# Altium footprint library Ixora.PcbLib: 199 footprints (part 12 of 13)
Each footprint in its own frame and in the unit in brackets; x right, y up, seen from the top. Pads: shape width x height; smd on the part's side, far side on the other; paste and mask are expansions set on the pad; w line width, h text height; cw(c..) or ccw(c..) is an arc to the next point about the centre after c.
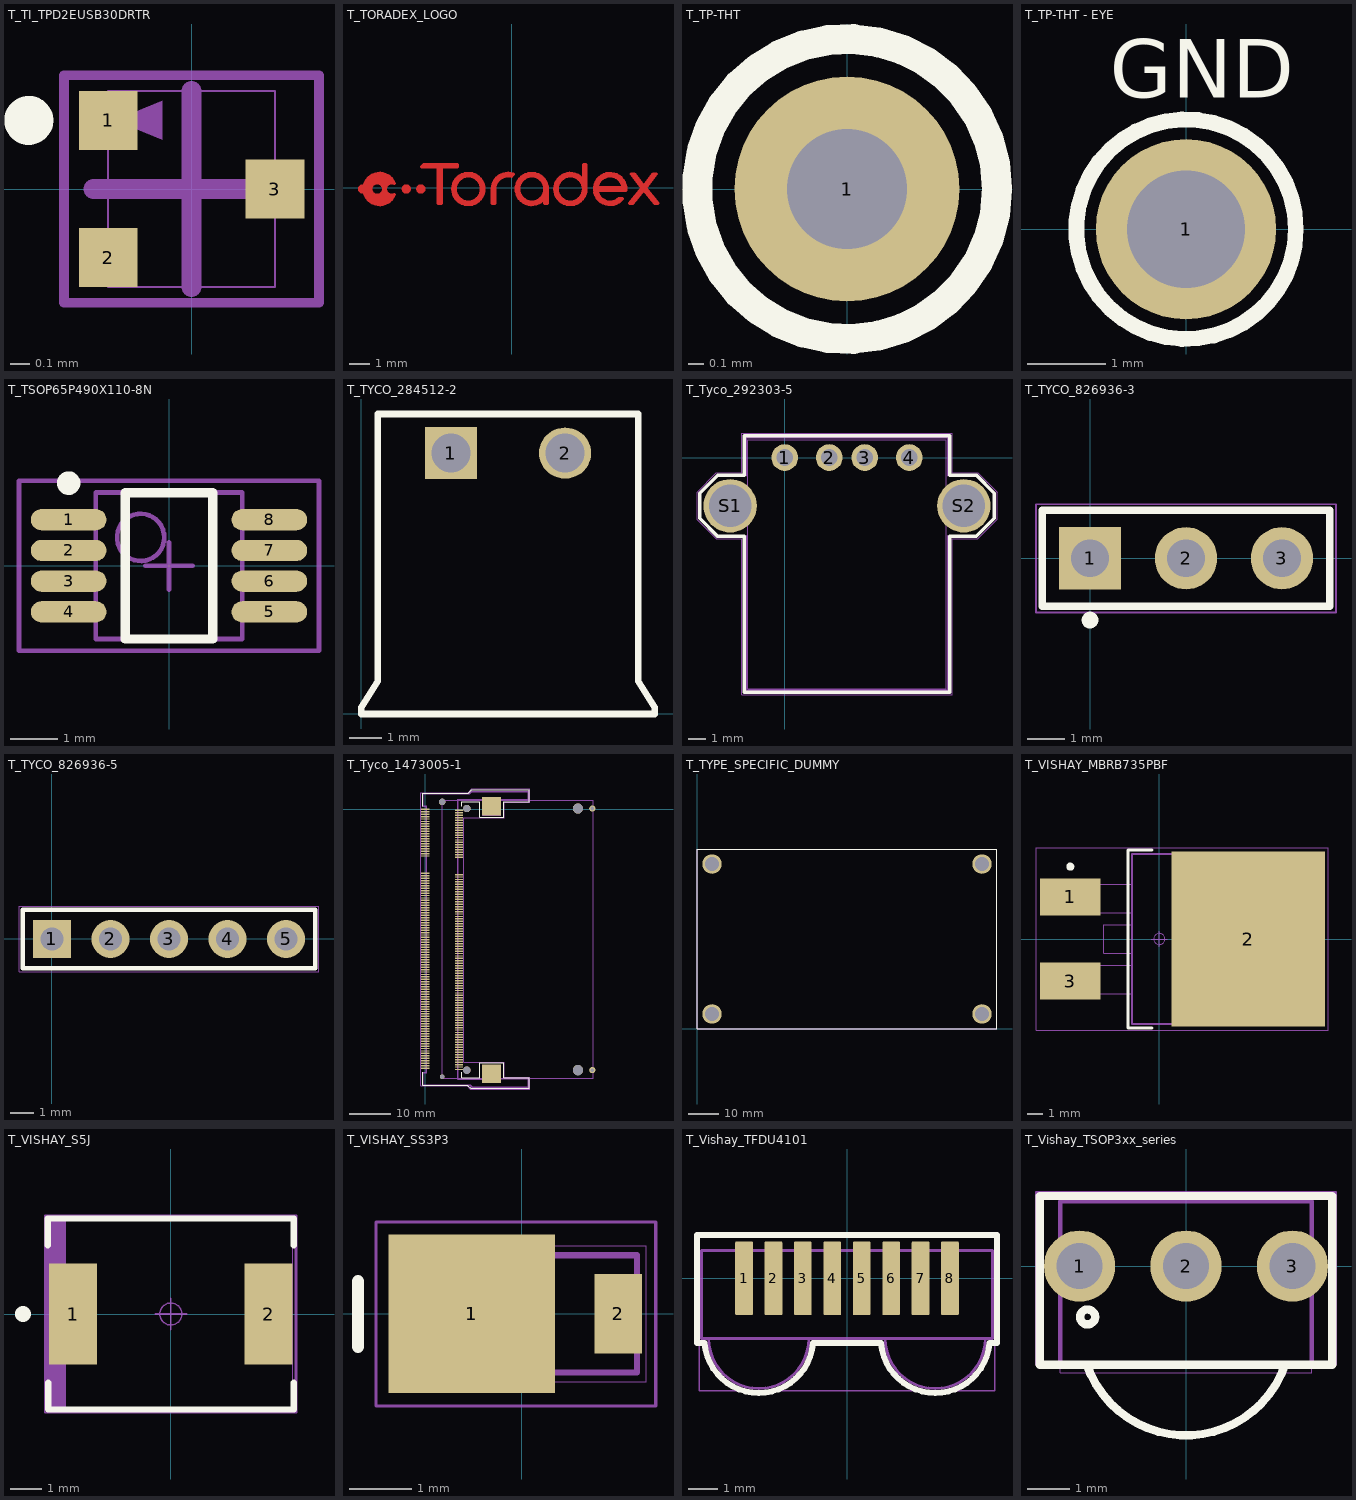
[diagram p11: the footprints below, top view; thin cyan lines are the x and y axes]

## T_TI_TPD2EUSB30DRTR [mm] "2 CHANNEL PROTECTION SOLUTION FOR SUPER-SPEED"
height 0.5
pads (3):
  rect 0.3x0.3 smd: 1(-0.425,0.35) 2(-0.425,-0.35) 3(0.425,0)
Top Overlay:
  circle w0.15: c-0.83,0.35 r0.05
Mechanical 1:
  lines w0.05: -0.65,-0.58 -0.65,0.58 0.65,0.58 0.65,-0.58 -0.65,-0.58
Mechanical 2:
  lines w0.01: -0.425,-0.5 0.425,-0.5 0.425,0.5 -0.425,0.5 -0.425,-0.5
Mechanical 3:
  region: -0.39,0.35 -0.15,0.45 -0.15,0.25
  lines w0.1: -0.5,0 0.5,0 ; 0,-0.5 0,0.5
3D body: height 0.5, standoff 0, extent -0.425,-0.5 0.425,0.5

## T_TORADEX_LOGO [mm] "Toradex Logo"
Top Layer:
  lines w0.15: -7.116,-0.05 -7,-0.05 ; -7.115,-0.198 cw(c-7.136,-0.05) -7.286,-0.05 cw(c-7.136,-0.05) -7.115,0.099 ; -7.044,-0.26 ccw(c-6.322,-0.05) -5.621,-0.319 ; -7.044,0.16 cw(c-6.322,-0.05) -5.621,0.22 ; -6.911,-0.118 ccw(c-7.104,-0.277) -7,-0.05 ; -6.911,0.019 cw(c-7.104,0.178) -7,-0.05 ; -6.764,-0.4 ccw(c-6.322,-0.05) -5.955,-0.477 cw(c-5.738,-0.05) -6.087,-0.379 cw(c-6.436,-0.05) -6.916,-0.05 cw(c-6.436,-0.05) -6.087,0.28 cw(c-5.738,-0.05) -5.955,0.378 ccw(c-6.322,-0.05) -6.764,0.301 ; -6.484,-0.59 ccw(c-6.436,-0.05) -6.087,-0.465 ccw(c-5.738,-0.05) -6.067,-0.481 cw(c-6.322,-0.05) -6.192,-0.533 ; -6.484,0.491 cw(c-6.436,-0.05) -6.087,0.366 cw(c-5.738,-0.05) -6.067,0.382 ccw(c-6.322,-0.05) -6.192,0.434 ; -5.636,-0.331 cw(c-5.738,-0.05) -5.636,0.232 ; 4.083,-0.046 4.702,-0.046 5.383,-0.046 ccw(c4.702,-0.05) 5.214,-0.499 ; 4.087,-0.116 4.702,-0.116 5.45,-0.116 ccw(c4.702,-0.05) 5.304,-0.499 5.127,-0.499 cw(c4.702,-0.05) 5.317,0.017 4.702,0.017 4.087,0.017 ; -7.241,-0.05 cw(c-7.136,-0.05) -7.121,0.054 ccw(c-7.104,0.178) -6.984,0.143 cw(c-6.322,-0.05) -5.732,0.305 ccw(c-5.738,-0.05) -6.087,0.015 ccw(c-6.436,-0.05) -6.087,-0.114 ccw(c-5.738,-0.05) -5.732,-0.404 cw(c-6.322,-0.05) -6.984,-0.242 ccw(c-7.104,-0.277) -7.121,-0.153 ; -7.241,-0.05 ccw(c-7.136,-0.05) -7.121,-0.153 ; -7.241,-0.05 ccw(c-7.136,-0.05) -7.121,-0.153 ; -7.178,-0.05 cw(c-7.136,-0.05) -7.13,-0.008 ccw(c-7.104,0.178) -6.924,0.126 cw(c-6.322,-0.05) -5.844,0.354 ccw(c-5.738,-0.05) -6.087,0.179 ccw(c-6.436,-0.05) -6.087,-0.278 ccw(c-5.738,-0.05) -5.844,-0.453 cw(c-6.322,-0.05) -6.924,-0.225 ccw(c-7.104,-0.277) -7.13,-0.091 cw(c-7.136,-0.05) -7.178,-0.05 ; -6.736,-0.05 ccw(c-6.436,-0.05) -6.136,-0.05 ccw(c-6.436,-0.05) -6.736,-0.05 ; -5.194,-0.05 cw(c-5.044,-0.05) -4.894,-0.05 cw(c-5.044,-0.05) -5.194,-0.05 ; -5.149,-0.05 cw(c-5.044,-0.05) -4.939,-0.05 cw(c-5.044,-0.05) -5.149,-0.05 ; -5.086,-0.05 cw(c-5.044,-0.05) -5.002,-0.05 cw(c-5.044,-0.05) -5.086,-0.05 ; -4.498,-0.05 cw(c-4.348,-0.05) -4.198,-0.05 cw(c-4.348,-0.05) -4.498,-0.05 ; -4.453,-0.05 cw(c-4.348,-0.05) -4.243,-0.05 cw(c-4.348,-0.05) -4.453,-0.05 ; -4.39,-0.05 cw(c-4.348,-0.05) -4.306,-0.05 cw(c-4.348,-0.05) -4.39,-0.05 ; -4.322,0.994 -3.523,0.994 -3.523,-0.75 -3.372,-0.75 -3.372,0.994 -2.603,0.994 -2.603,1.125 -4.218,1.125 -4.322,0.994 ; -4.192,1.057 -3.46,1.057 -3.46,-0.688 -3.434,-0.688 -3.434,1.057 -2.665,1.057 -2.665,1.062 -4.188,1.062 -4.192,1.057 ; -2.827,-0.05 cw(c-2.076,-0.05) -1.324,-0.05 cw(c-2.076,-0.05) -2.827,-0.05 ; -2.764,-0.05 cw(c-2.076,-0.05) -1.387,-0.05 cw(c-2.076,-0.05) -2.764,-0.05 ; -2.694,-0.05 cw(c-2.076,-0.05) -1.457,-0.05 cw(c-2.076,-0.05) -2.694,-0.05 ; -0.939,-0.75 -0.806,-0.75 -0.806,-0.05 cw(c-0.188,-0.05) -0.009,0.542 cw(c0.958,-0.05) 0.071,0.656 ccw(c-0.188,-0.05) -0.939,-0.05 -0.939,-0.75 ; -0.877,-0.688 -0.869,-0.688 -0.869,-0.05 cw(c-0.188,-0.05) -0.037,0.615 cw(c0.958,-0.049) -0.032,0.621 ccw(c-0.188,-0.05) -0.877,-0.05 -0.877,-0.688 ; 0.207,-0.05 cw(c0.958,-0.05) 1.709,-0.05 1.709,-0.75 1.576,-0.75 1.576,-0.476 cw(c0.958,-0.05) 0.207,-0.05 ; 0.269,-0.05 cw(c0.958,-0.05) 1.647,-0.05 1.647,-0.688 1.639,-0.688 1.639,-0.153 cw(c0.958,-0.05) 0.269,-0.05 ; 0.339,-0.05 ccw(c0.958,-0.05) 1.576,-0.05 ccw(c0.958,-0.05) 0.339,-0.05 ; 2.053,-0.05 cw(c2.804,-0.05) 3.423,0.377 3.423,1.125 3.556,1.125 3.556,-0.05 cw(c2.804,-0.05) 2.053,-0.05 ; 2.116,-0.05 cw(c2.804,-0.05) 3.485,0.054 3.485,1.062 3.493,1.062 3.493,-0.05 cw(c2.804,-0.05) 2.116,-0.05 ; 2.186,-0.05 ccw(c2.804,-0.05) 3.423,-0.05 ccw(c2.804,-0.05) 2.186,-0.05 ; 5.623,-0.75 5.791,-0.75 6.314,-0.086 6.835,-0.75 6.995,-0.75 6.403,0.006 6.919,0.664 6.749,0.664 6.314,0.1 5.879,0.664 5.716,0.664 6.23,0.006 5.623,-0.75 ; 5.753,-0.688 5.761,-0.688 6.315,0.015 6.865,-0.688 6.866,-0.688 6.323,0.006 6.79,0.602 6.78,0.602 6.314,-0.002 5.849,0.602 5.844,0.602 6.309,0.005 5.753,-0.688
Top Solder:
  lines w0.35: -7.116,-0.05 -7,-0.05 ; -7.115,-0.198 cw(c-7.136,-0.05) -7.286,-0.05 cw(c-7.136,-0.05) -7.115,0.099 ; -7.113,-0.215 cw(c-7.104,-0.277) -7.044,-0.26 ccw(c-6.322,-0.05) -5.621,-0.319 ; -7.113,0.116 ccw(c-7.104,0.178) -7.044,0.16 cw(c-6.322,-0.05) -5.621,0.22 ; -6.911,-0.118 ccw(c-7.104,-0.277) -7,-0.05 ; -6.911,0.019 cw(c-7.104,0.178) -7,-0.05 ; -6.764,-0.4 ccw(c-6.322,-0.05) -5.955,-0.477 cw(c-5.738,-0.05) -6.087,-0.379 cw(c-6.436,-0.05) -6.916,-0.05 cw(c-6.436,-0.05) -6.087,0.28 cw(c-5.738,-0.05) -5.955,0.378 ccw(c-6.322,-0.05) -6.764,0.301 ; -6.484,-0.59 ccw(c-6.436,-0.05) -6.087,-0.465 ccw(c-5.738,-0.05) -6.067,-0.481 cw(c-6.322,-0.05) -6.192,-0.533 ; -6.484,0.491 cw(c-6.436,-0.05) -6.087,0.366 cw(c-5.738,-0.05) -6.067,0.382 ccw(c-6.322,-0.05) -6.192,0.434 ; -5.631,-0.33 cw(c-5.738,-0.05) -5.631,0.231 ; 4.083,-0.046 4.702,-0.046 5.383,-0.046 ccw(c4.702,-0.05) 5.214,-0.499 ; 4.087,-0.116 4.702,-0.116 5.45,-0.116 ccw(c4.702,-0.05) 5.304,-0.499 5.127,-0.499 cw(c4.702,-0.05) 5.317,0.017 4.702,0.017 4.087,0.017 ; -7.241,-0.05 cw(c-7.136,-0.05) -7.121,0.054 ccw(c-7.104,0.178) -6.984,0.143 cw(c-6.322,-0.05) -5.732,0.305 ccw(c-5.738,-0.05) -6.087,0.015 ccw(c-6.436,-0.05) -6.087,-0.114 ccw(c-5.738,-0.05) -5.732,-0.404 cw(c-6.322,-0.05) -6.984,-0.242 ccw(c-7.104,-0.277) -7.121,-0.153 ; -7.241,-0.05 ccw(c-7.136,-0.05) -7.121,-0.153 ; -7.241,-0.05 ccw(c-7.136,-0.05) -7.121,-0.153 ; -7.178,-0.05 cw(c-7.136,-0.05) -7.13,-0.008 ccw(c-7.104,0.178) -6.924,0.126 cw(c-6.322,-0.05) -5.844,0.354 ccw(c-5.738,-0.05) -6.087,0.179 ccw(c-6.436,-0.05) -6.087,-0.278 ccw(c-5.738,-0.05) -5.844,-0.453 cw(c-6.322,-0.05) -6.924,-0.225 ccw(c-7.104,-0.277) -7.13,-0.091 cw(c-7.136,-0.05) -7.178,-0.05 ; -6.736,-0.05 ccw(c-6.436,-0.05) -6.136,-0.05 ccw(c-6.436,-0.05) -6.736,-0.05 ; -5.194,-0.05 cw(c-5.044,-0.05) -4.894,-0.05 cw(c-5.044,-0.05) -5.194,-0.05 ; -5.149,-0.05 cw(c-5.044,-0.05) -4.939,-0.05 cw(c-5.044,-0.05) -5.149,-0.05 ; -5.086,-0.05 cw(c-5.044,-0.05) -5.002,-0.05 cw(c-5.044,-0.05) -5.086,-0.05 ; -4.498,-0.05 cw(c-4.348,-0.05) -4.198,-0.05 cw(c-4.348,-0.05) -4.498,-0.05 ; -4.453,-0.05 cw(c-4.348,-0.05) -4.243,-0.05 cw(c-4.348,-0.05) -4.453,-0.05 ; -4.39,-0.05 cw(c-4.348,-0.05) -4.306,-0.05 cw(c-4.348,-0.05) -4.39,-0.05 ; -4.322,0.994 -3.523,0.994 -3.523,-0.75 -3.372,-0.75 -3.372,0.994 -2.603,0.994 -2.603,1.125 -4.218,1.125 -4.322,0.994 ; -4.192,1.057 -3.46,1.057 -3.46,-0.688 -3.434,-0.688 -3.434,1.057 -2.665,1.057 -2.665,1.062 -4.188,1.062 -4.192,1.057 ; -2.827,-0.05 cw(c-2.076,-0.05) -1.324,-0.05 cw(c-2.076,-0.05) -2.827,-0.05 ; -2.764,-0.05 cw(c-2.076,-0.05) -1.387,-0.05 cw(c-2.076,-0.05) -2.764,-0.05 ; -2.694,-0.05 cw(c-2.076,-0.05) -1.457,-0.05 cw(c-2.076,-0.05) -2.694,-0.05 ; -0.939,-0.75 -0.806,-0.75 -0.806,-0.05 cw(c-0.188,-0.05) -0.009,0.542 cw(c0.958,-0.05) 0.071,0.656 ccw(c-0.188,-0.05) -0.939,-0.05 -0.939,-0.75 ; -0.877,-0.688 -0.869,-0.688 -0.869,-0.05 cw(c-0.188,-0.05) -0.037,0.615 cw(c0.958,-0.049) -0.032,0.621 ccw(c-0.188,-0.05) -0.877,-0.05 -0.877,-0.688 ; 0.207,-0.05 cw(c0.958,-0.05) 1.709,-0.05 1.709,-0.75 1.576,-0.75 1.576,-0.476 cw(c0.958,-0.05) 0.207,-0.05 ; 0.269,-0.05 cw(c0.958,-0.05) 1.647,-0.05 1.647,-0.688 1.639,-0.688 1.639,-0.153 cw(c0.958,-0.05) 0.269,-0.05 ; 0.339,-0.05 ccw(c0.958,-0.05) 1.576,-0.05 ccw(c0.958,-0.05) 0.339,-0.05 ; 2.053,-0.05 cw(c2.804,-0.05) 3.423,0.377 3.423,1.125 3.556,1.125 3.556,-0.05 cw(c2.804,-0.05) 2.053,-0.05 ; 2.116,-0.05 cw(c2.804,-0.05) 3.485,0.054 3.485,1.062 3.493,1.062 3.493,-0.05 cw(c2.804,-0.05) 2.116,-0.05 ; 2.186,-0.05 ccw(c2.804,-0.05) 3.423,-0.05 ccw(c2.804,-0.05) 2.186,-0.05 ; 5.623,-0.75 5.791,-0.75 6.314,-0.086 6.835,-0.75 6.995,-0.75 6.403,0.006 6.919,0.664 6.749,0.664 6.314,0.1 5.879,0.664 5.716,0.664 6.23,0.006 5.623,-0.75 ; 5.753,-0.688 5.761,-0.688 6.315,0.015 6.865,-0.688 6.866,-0.688 6.323,0.006 6.79,0.602 6.78,0.602 6.314,-0.002 5.849,0.602 5.844,0.602 6.309,0.005 5.753,-0.688

## T_TP-THT [mm] "Testpin TH"
pads (1):
  round 1.5 hole 0.8: 1(0,0)
Top Overlay:
  circle w0.2: c0,0 r1

## T_TP-THT - EYE [mm] "Testpin TH"
pads (1):
  round 2.3 hole 1.5: 1(0,0)
Top Overlay:
  circle w0.2: c0,0 r1.4
  text "GND" at -0.975,1.675 h0.75
3D body "User Library-TEST POINT BLK Keystone 5011.STEP": height 8.14, standoff -3.08, extent -1.587,-1.587 1.588,1.588

## T_TSOP65P490X110-8N [mm] "TSOP, 8-Leads, Body 3.1x3.1mm (max), Pitch 0.65mm, IPC Medium Density"
height 1.1
pads (8):
  oval 1.6x0.45 smd: 1(-2.125,0.975) 2(-2.125,0.325) 3(-2.125,-0.325) 4(-2.125,-0.975) 5(2.125,-0.975) 6(2.125,-0.325) 7(2.125,0.325) 8(2.125,0.975)
Top Overlay:
  circle w0.25: c-2.125,1.75 r0.125
  lines w0.2: -0.925,-1.55 0.925,-1.55 0.925,1.55 -0.925,1.55 -0.925,-1.55
Mechanical 1:
  lines w0.1: -0.5,0 0.5,0 ; 0,-0.5 0,0.5 ; -3.175,-1.8 3.175,-1.8 3.175,1.8 -3.175,1.8 -3.175,-1.8
Mechanical 3:
  circle w0.1: c-0.6,0.6 r0.5
  lines w0.1: -1.55,-1.55 1.55,-1.55 1.55,1.55 -1.55,1.55 -1.55,-1.55
3D body: height 0.15, standoff 0, extent 1.626,0.782 2.184,1.163
3D body: height 0.3, standoff 0.15, extent 1.524,0.782 1.905,1.163
3D body: height 0.15, standoff 0, extent 1.626,0.132 2.184,0.513
3D body: height 0.3, standoff 0.15, extent 1.524,0.132 1.905,0.513
3D body: height 0.15, standoff 0, extent 1.626,-0.518 2.184,-0.137
3D body: height 0.3, standoff 0.15, extent 1.524,-0.518 1.905,-0.137
3D body: height 0.15, standoff 0, extent 1.626,-1.168 2.184,-0.787
3D body: height 0.3, standoff 0.15, extent 1.524,-1.168 1.905,-0.787
3D body: height 0.15, standoff 0, extent -2.184,-1.163 -1.626,-0.782
3D body: height 0.3, standoff 0.15, extent -1.905,-1.163 -1.524,-0.782
3D body: height 0.15, standoff 0, extent -2.184,-0.513 -1.626,-0.132
3D body: height 0.3, standoff 0.15, extent -1.905,-0.513 -1.524,-0.132
3D body: height 0.15, standoff 0, extent -2.184,0.137 -1.626,0.518
3D body: height 0.3, standoff 0.15, extent -1.905,0.137 -1.524,0.518
3D body: height 0.3, standoff 0.15, extent -1.905,0.787 -1.524,1.168
3D body: height 0.15, standoff 0, extent -2.184,0.787 -1.626,1.168
3D body: height 1.1, standoff 0.14, extent -1.55,-1.55 1.55,1.55

## T_TYCO_284512-2 [mm] "Power Connector 3.5mm"
height 7.3
pads (2):
  rect 1.6x1.6 hole 1.2: 1(2.75,8)
  oval 1.6x1.56 hole 1.2: 2(6.25,8)
Top Overlay:
  lines w0.2: 0,0 0,0.2 0.5,1 0.5,9.2 8.5,9.2 8.5,1 9,0.2 9,0 0.001,0
Mechanical 1:
  lines w0.05: 0,0 9,0 9,0.2 8.5,1 8.5,9.2 0.5,9.2 0.5,1 0,0.2 0,0
Mechanical 2:
  lines w0.001: 0,0 9,0 9,0.2 8.5,1 8.5,9.2 0.5,9.2 0.5,1 0,0.2 0,0
Mechanical 3:
  lines w0.1: 0,0 9,0 9,0.2 8.5,1 8.5,9.2 0.5,9.2 0.5,1 0,0.2 0,0
3D body "c-284512-2-e1-3d.stp": height 7.27, standoff -3.38, extent 0,0 9,9.2

## T_Tyco_292303-5 [mm] "USB Type A Connector"
height 7.01
pads (6):
  round 1.5 hole 0.95: 1(0,0) 2(2.5,0) 3(4.5,0) 4(7,0)
  round 3 hole 2.38: S1(-3.07,-2.71) S2(10.07,-2.71)
Top Overlay:
  lines w0.2: -4.78,-3.415 -3.78,-4.415 -2.27,-4.415 -2.27,-13.19 9.27,-13.19 9.27,-4.415 10.77,-4.415 11.78,-3.405 11.78,-1.995 10.78,-0.995 9.27,-0.995 9.27,1.23 -2.27,1.23 -2.27,-0.995 -3.77,-0.995 -4.78,-2.005 -4.78,-3.415
Mechanical 1:
  lines w0.05: -4.93,-3.485 -3.85,-4.565 -2.42,-4.565 -2.42,-13.34 9.42,-13.34 9.42,-4.565 10.84,-4.565 11.93,-3.475 11.93,-1.935 10.84,-0.845 9.42,-0.845 9.42,1.38 -2.42,1.38 -2.42,-0.845 -3.84,-0.845 -4.93,-1.935 -4.93,-3.485
Mechanical 2:
  lines w0.001: -2.065,-12.99 -2.065,1.01 9.065,1.01 9.065,-12.99 -2.065,-12.99
Mechanical 3:
  lines w0.1: -2.16,-13.09 -2.16,-4.405 ; -2.16,-13.08 9.16,-13.08 ; -2.16,-1.019 -2.16,1.11 9.16,1.11 9.16,-1.019 ; 9.16,-13.09 9.16,-4.405

## T_TYCO_826936-3 [mm] "Connector; Header; 3 Position"
height 8.4
pads (3):
  rect 1.65x1.65 hole 1: 1(0,0)
  round 1.65 hole 1: 2(2.54,0) 3(5.08,0)
Top Overlay:
  circle w0.254: c0,-1.635 r0.095
  lines w0.2: -1.27,-1.27 6.35,-1.27 6.35,1.27 -1.27,1.27 -1.27,-1.27
Mechanical 1:
  lines w0.05: -1.43,-1.43 6.51,-1.43 6.51,1.43 -1.43,1.43 -1.43,-1.43
Mechanical 2:
  lines w0.001: -1.27,-1.27 -1.27,1.27 6.35,1.27 6.35,-1.27 -1.27,-1.27
Mechanical 3:
  lines w0.1: -1.27,-1.27 -1.27,1.27 6.35,1.27 6.35,-1.27 -1.27,-1.27
3D body "Samtec-TSW-103-07-G-S, Jumper with 3 pins, male.step": height 8.4, standoff -2.52, extent -1.27,-1.27 6.35,1.27

## T_TYCO_826936-5 [mm] "Connector, Header, 5 Position, 2.54mm pitch"
height 8.4
pads (5):
  rect 1.65x1.65 hole 1: 1(0,0)
  round 1.65 hole 1: 2(2.54,0) 3(5.08,0) 4(7.62,0) 5(10.16,0)
Top Overlay:
  lines w0.2: -1.27,-1.27 11.43,-1.27 11.43,1.27 -1.27,1.27 -1.27,-1.27
Mechanical 1:
  lines w0.05: -1.43,-1.43 11.59,-1.43 11.59,1.43 -1.43,1.43 -1.43,-1.43
Mechanical 2:
  lines w0.001: 11.43,-1.275 -1.27,-1.275 -1.27,1.27 11.43,1.27 11.43,-1.27
Mechanical 3:
  lines w0.1: 11.425,-1.27 -1.27,-1.27 -1.27,1.27 11.425,1.27 ; 11.43,-1.27 11.43,1.27

## T_Tyco_1473005-1 [mm] "SODIMM Connector"
height 5.2
pads (210):
  rect 2x0.35 smd: 1(0,0) 2(8.2,-0.3) 3(0,-0.6) 4(8.2,-0.9) 5(0,-1.2) 6(8.2,-1.5) 7(0,-1.8) 8(8.2,-2.1) 9(0,-2.4) 10(8.2,-2.7) 11(0,-3) 12(8.2,-3.3) 13(0,-3.6) 14(8.2,-3.9) 15(0,-4.2) 16(8.2,-4.5) 17(0,-4.8) 18(8.2,-5.1) 19(0,-5.4) 20(8.2,-5.7) 21(0,-6) 22(8.2,-6.3) 23(0,-6.6) 24(8.2,-6.9) 25(0,-7.2) 26(8.2,-7.5) 27(0,-7.8) 28(8.2,-8.1) 29(0,-8.4) 30(8.2,-8.7) 31(0,-9) 32(8.2,-9.3) 33(0,-9.6) 34(8.2,-9.9) 35(0,-10.2) 36(8.2,-10.5) 37(0,-10.8) 38(8.2,-11.1) 39(0,-11.4) 40(8.2,-11.7) 41(0,-15.6) 42(8.2,-15.9) 43(0,-16.2) 44(8.2,-16.5) 45(0,-16.8) 46(8.2,-17.1) 47(0,-17.4) 48(8.2,-17.7) 49(0,-18) 50(8.2,-18.3) 51(0,-18.6) 52(8.2,-18.9) 53(0,-19.2) 54(8.2,-19.5) 55(0,-19.8) 56(8.2,-20.1) 57(0,-20.4) 58(8.2,-20.7) 59(0,-21) 60(8.2,-21.3) 61(0,-21.6) 62(8.2,-21.9) 63(0,-22.2) 64(8.2,-22.5) 65(0,-22.8) 66(8.2,-23.1) 67(0,-23.4) 68(8.2,-23.7) 69(0,-24) 70(8.2,-24.3) 71(0,-24.6) 72(8.2,-24.9) 73(0,-25.2) 74(8.2,-25.5) 75(0,-25.8) 76(8.2,-26.1) 77(0,-26.4) 78(8.2,-26.7) 79(0,-27) 80(8.2,-27.3) 81(0,-27.6) 82(8.2,-27.9) 83(0,-28.2) 84(8.2,-28.5) 85(0,-28.8) 86(8.2,-29.1) 87(0,-29.4) 88(8.2,-29.7) 89(0,-30) 90(8.2,-30.3) 91(0,-30.6) 92(8.2,-30.9) 93(0,-31.2) 94(8.2,-31.5) 95(0,-31.8) 96(8.2,-32.1) 97(0,-32.4) 98(8.2,-32.7) 99(0,-33) 100(8.2,-33.3) 101(0,-33.6) 102(8.2,-33.9) 103(0,-34.2) 104(8.2,-34.5) 105(0,-34.8) 106(8.2,-35.1) 107(0,-35.4) 108(8.2,-35.7) 109(0,-36) 110(8.2,-36.3) 111(0,-36.6) 112(8.2,-36.9) 113(0,-37.2) 114(8.2,-37.5) 115(0,-37.8) 116(8.2,-38.1) 117(0,-38.4) 118(8.2,-38.7) 119(0,-39) 120(8.2,-39.3) 121(0,-39.6) 122(8.2,-39.9) 123(0,-40.2) 124(8.2,-40.5) 125(0,-40.8) 126(8.2,-41.1) 127(0,-41.4) 128(8.2,-41.7) 129(0,-42) 130(8.2,-42.3) 131(0,-42.6) 132(8.2,-42.9) 133(0,-43.2) 134(8.2,-43.5) 135(0,-43.8) 136(8.2,-44.1) 137(0,-44.4) 138(8.2,-44.7) 139(0,-45) 140(8.2,-45.3) 141(0,-45.6) 142(8.2,-45.9) 143(0,-46.2) 144(8.2,-46.5) 145(0,-46.8) 146(8.2,-47.1) 147(0,-47.4) 148(8.2,-47.7) 149(0,-48) 150(8.2,-48.3) 151(0,-48.6) 152(8.2,-48.9) 153(0,-49.2) 154(8.2,-49.5) 155(0,-49.8) 156(8.2,-50.1) 157(0,-50.4) 158(8.2,-50.7) 159(0,-51) 160(8.2,-51.3) 161(0,-51.6) 162(8.2,-51.9) 163(0,-52.2) 164(8.2,-52.5) 165(0,-52.8) 166(8.2,-53.1) 167(0,-53.4) 168(8.2,-53.7) 169(0,-54) 170(8.2,-54.3) 171(0,-54.6) 172(8.2,-54.9) 173(0,-55.2) 174(8.2,-55.5) 175(0,-55.8) 176(8.2,-56.1) 177(0,-56.4) 178(8.2,-56.7) 179(0,-57) 180(8.2,-57.3) 181(0,-57.6) 182(8.2,-57.9) 183(0,-58.2) 184(8.2,-58.5) 185(0,-58.8) 186(8.2,-59.1) 187(0,-59.4) 188(8.2,-59.7) 189(0,-60) 190(8.2,-60.3) 191(0,-60.6) 192(8.2,-60.9) 193(0,-61.2) 194(8.2,-61.5) 195(0,-61.8) 196(8.2,-62.1) 197(0,-62.4) 198(8.2,-62.7) 199(0,-63) 200(8.2,-63.3)
  round 1.1 hole 1.1 unplated: ""(4.1,-65.05)
  round 1.6 hole 1.6 unplated: ""(4.1,1.75)
  round 1.8 hole 1.8 unplated: ""(10.1,-63.45) ""(10.1,0.15)
  rect 4.6x4.5 smd: ""(16.1,-64.35) ""(16.1,0.75)
  round 2.5 hole 2.5 unplated: ""(37.1,-63.45) ""(37.1,0.15)
  round 1.5 hole 0.9: ""(40.6,-63.45) ""(40.6,0.15)
Top Overlay:
  lines w0.2: -0.635,-63.962 -0.635,-67.1 7,-67.1 ; -0.635,0.715 -0.635,3.881 6.969,3.881 6.97,3.88 10.48,3.88 11.35,4.75 25.273,4.75 25.273,1.85 19.05,1.85 19.05,-1.951 13.2,-1.951 13.2,1.75 8.9,1.75 8.9,0.715 ; 6.95,-67.1 10.25,-67.1 11.05,-67.9 25.273,-67.9 25.273,-65.35 ; 8.9,-65.3 13.208,-65.3 13.208,-61.641 19.05,-61.641 19.05,-65.35 25.2,-65.35 ; 8.9,-65.282 8.9,-63.962
Mechanical 1:
  lines w0.05: -1.141,-67.249 10.189,-67.249 10.983,-68.043 11.251,-68.043 25.413,-68.043 25.413,-65.211 19.191,-65.211 19.191,-61.502 9.374,-61.502 9.374,-2.1 19.2,-2.1 19.2,1.705 25.42,1.705 25.42,4.897 11.289,4.897 10.42,4.028 -1.141,4.028 -1.141,-67.249
Mechanical 2:
  lines w0.001: -0.635,-67.102 6.223,-67.102 10.795,-67.102 11.303,-67.61 25.146,-67.61 25.146,-65.451 18.288,-65.451 18.288,-62.276 13.97,-62.276 13.97,-65.451 8.001,-65.451 8.001,2.24 13.97,2.24 13.97,-1.443 18.288,-1.443 18.288,2.24 25.146,2.24 25.146,4.399 11.303,4.399 10.795,3.891 6.223,3.891 -0.635,3.891 -0.635,0.716 0.254,0.716 0.254,-63.962 -0.635,-63.962 -0.635,-67.102 ; 4.1,-65.45 40.8,-65.45 40.8,2.15 4.1,2.15 4.1,-65.45
Mechanical 3:
  lines w0.1: -0.508,-66.975 5.969,-66.975 10.922,-66.975 11.43,-67.483 25.019,-67.483 25.019,-65.578 18.161,-65.578 18.161,-62.403 14.097,-62.403 14.097,-65.705 7.874,-65.705 7.874,2.367 14.097,2.367 14.097,-1.189 18.161,-1.189 18.161,2.367 25.019,2.367 25.019,4.272 11.303,4.272 10.795,3.764 5.969,3.764 -0.508,3.764 -0.508,0.843 0.381,0.843 0.381,-64.054 -0.508,-64.054 -0.508,-66.975
3D body "c-1473005-1-j1-3d.stp": height 5.22, standoff -0.68, extent -0.9,-67.4 25.15,4.1

## T_TYPE_SPECIFIC_DUMMY [mm] "DUMMY TYPE SPECIFIC"
pads (4):
  round 6.5 hole 4.7: ""(5,5) ""(5,55) ""(95,5) ""(95,55)
Top Overlay:
  lines w0.2: 0,0 100,0 100,60 0,60 0,0
Mechanical 2:
  lines w0.01: 0,0 0,60 100,60 100,0 0,0
3D body: height 8, standoff 0, extent 3.257,3.253 6.743,6.747
3D body: height 8, standoff 0, extent 2.261,2.255 7.739,7.745
3D body: height 8, standoff 0, extent 92.261,2.255 97.739,7.745
3D body: height 8, standoff 0, extent 93.257,3.253 96.743,6.747
3D body: height 8, standoff 0, extent 92.261,52.255 97.739,57.745
3D body: height 8, standoff 0, extent 93.257,53.253 96.743,56.747
3D body: height 8, standoff 0, extent 2.261,52.255 7.739,57.745
3D body: height 8, standoff 0, extent 3.257,53.253 6.743,56.747

## T_VISHAY_MBRB735PBF [mm]
height 4.83
pads (3):
  rect 3.81x2.32 smd: 1(-5.585,2.64) 3(-5.585,-2.64)
  rect 9.65x11 smd: 2(5.585,0)
Top Overlay:
  circle w0.25: c-5.585,4.54 r0.125
  lines w0.2: -0.465,-5.585 -1.965,-5.585 -1.965,5.585 -0.465,5.585
Mechanical 1:
  circle w0.05: c0,0 r0.35
  lines w0.05: -0.5,0 0.5,0 ; 0,-0.5 0,0.5 ; -7.735,-5.72 10.605,-5.72 10.605,5.72 -7.735,5.72 -7.735,-5.72
Mechanical 2:
  lines w0.001: -1.715,-3.43 -6.295,-3.43 -6.295,-1.65 -1.715,-1.65 ; -1.715,-0.89 -3.495,-0.89 -3.495,0.89 -1.715,0.89 ; -1.715,1.65 -6.295,1.65 -6.295,3.43 -1.715,3.43 ; 7.935,-5.335 7.935,5.335 ; -1.715,-5.335 8.74,-5.335 9.585,-4.49 9.585,4.49 8.74,5.335 -1.715,5.335 -1.715,-5.335
Mechanical 3:
  lines w0.1: 7.935,-5.335 8.74,-5.335 9.585,-4.49 9.585,4.49 8.74,5.335 7.935,5.335 ; 7.935,-5.335 7.935,5.335 ; 7.935,-5.335 -1.715,-5.335 -1.715,5.335 7.935,5.335
3D body: height 3.56, standoff 3.03, extent -3.495,-0.89 -1.715,0.89
3D body: height 0.53, standoff 0, extent -6.295,-3.43 -4.105,-1.65
3D body: height 0.53, standoff 0, extent -6.295,1.65 -4.105,3.43
3D body: height 1.4, standoff 0, extent 7.935,-5.335 9.585,5.335
3D body: height 4.83, standoff 0, extent -1.715,-5.335 7.935,5.335
3D body: height 3.56, standoff 0, extent -4.105,-3.43 -3.5,-1.65
3D body: height 3.56, standoff 0, extent -4.105,1.65 -3.5,3.43
3D body: height 3.56, standoff 3.03, extent -3.5,1.65 -1.715,3.43
3D body: height 3.56, standoff 3.03, extent -3.5,-3.43 -1.715,-1.65

## T_VISHAY_S5J [mm] "5A Rectifier"
height 2.62
pads (2):
  rect 1.52x3.2 smd: 1(-3.105,0) 2(3.105,0)
Top Overlay:
  circle w0.25: c-4.697,0 r0.125
  lines w0.2: -3.906,2.187 -3.906,3.032 3.902,3.032 3.902,2.187 ; -3.893,-2.187 -3.893,-3.032 3.902,-3.032 3.902,-2.187
Mechanical 1:
  circle w0.05: c0,0 r0.35
  lines w0.05: -0.5,0 0.5,0 ; 0,-0.5 0,0.5 ; -4.001,-3.141 4.001,-3.141 4.001,3.141 -4.001,3.141 -4.001,-3.141
Mechanical 2:
  lines w0.001: -3.875,-3.11 3.875,-3.11 3.875,3.11 -3.875,3.11 -3.875,-3.11
Mechanical 3:
  lines w0.1: -3.879,-3.032 -3.879,3.032 ; -3.777,-3.032 -3.777,3.032 ; -3.676,-3.032 -3.676,3.032 ; -3.575,-3.032 -3.575,3.032 ; -3.474,-3.032 -3.474,3.032 ; -3.373,-3.032 -3.373,3.032 ; -3.929,-3.032 3.978,-3.032 3.978,3.032 -3.929,3.032 -3.929,-3.032

## T_VISHAY_SS3P3 [mm] "Schottky Barrier Rectifiers. 2-Leads, Body 3.7x1.88mm"
height 1.15
pads (2):
  rect 2.67x2.54 smd: 1(-0.8,0)
  rect 0.762x1.27 smd: 2(1.551,0)
Top Overlay:
  lines w0.2: -2.628,-0.529 -2.628,0.521
Mechanical 1:
  lines w0.05: -2.339,-1.482 2.15,-1.482 2.15,1.476 -2.339,1.476 -2.339,-1.482
Mechanical 2:
  lines w0.001: -1.7,-1.09 -1.7,1.09 ; -1.3,-1.09 -1.3,1.09 ; -2,-1.09 2,-1.09 2,1.09 -2,1.09 -2,-1.09
Mechanical 3:
  rectangle: -1.9,-0.94 -1.443,0.94
  lines w0.1: -1.85,-0.94 1.85,-0.94 1.85,0.94 -1.85,0.94 ; -1.7,-0.9 -1.7,0.9
3D body: height 1.15, standoff 0, extent -1.7,-1.09 -1.3,1.09
3D body: height 0.35, standoff 0, extent -2,-0.675 -1.7,0.675
3D body: height 1.15, standoff 0, extent -1.3,-1.09 -0.84,1.09
3D body: height 1.15, standoff 0, extent -0.84,-1.09 1.55,1.09
3D body: height 0.35, standoff 0, extent 1.55,-0.455 2,0.455

## T_Vishay_TFDU4101 [mm] "Infrared Transceiver Module"
height 4
pads (8):
  rrect12% 0.6x2.5 smd: 1(-3.5,0) 2(-2.5,0) 3(-1.5,0) 4(-0.5,0) 5(0.5,0) 6(1.5,0) 7(2.5,0) 8(3.5,0)
Top Overlay:
  lines w0.2: -4.85,-2.2 -5.1,-2.2 -5.1,1.475 5.1,1.475 5.1,-2.2 4.85,-2.2 ; -4.844,-2.2 ccw(c-3,-2.05) -1.156,-2.2 ; -1.15,-2.2 1.15,-2.2 ; 1.156,-2.2 ccw(c3,-2.05) 4.844,-2.2
Mechanical 1:
  lines w0.05: -5.025,-3.825 -5.025,1.4 5.025,1.4 5.025,-3.825 -5.025,-3.825
Mechanical 2:
  lines w0.001: -4.7,-2.05 ccw(c-3,-2.05) -1.3,-2.05 ; 1.3,-2.05 ccw(c3,-2.05) 4.7,-2.05 ; -4.95,-2.05 4.95,-2.05 4.95,0.95 -4.95,0.95 -4.95,-2.05
Mechanical 3:
  lines w0.1: -4.7,-2.05 ccw(c-3,-2.05) -1.3,-2.05 ; 1.3,-2.05 ccw(c3,-2.05) 4.7,-2.05 ; -4.95,-2.05 -4.95,0.95 4.95,0.95 4.95,-2.05 -4.95,-2.05
3D body "User Library-TFDU4101.STEP": height 4.32, standoff 0.02, extent -4.956,-3.941 4.95,1.367

## T_Vishay_TSOP3xx_series [mm] "IR Receiver Module for Remote Control Systems"
height 10.25
pads (3):
  round 1.7 hole 1.1: 1(-2.54,0) 2(0,0) 3(2.54,0)
Top Overlay:
  circle w0.2: c-2.348,-1.213 r0.178
  lines w0.2: -2.366,-2.35 ccw(c-0.001,-1.54) 2.365,-2.348 ; -3.49,-2.35 3.49,-2.35 3.49,1.675 -3.49,1.675 -3.49,-2.35
Mechanical 1:
  lines w0.05: -3.58,-2.35 -3.58,1.765 3.58,1.765 3.58,-2.35 -3.58,-2.35
Mechanical 2:
  lines w0.01: -2.369,-2.35 ccw(c0,-1.55) 2.369,-2.35 ; -3,-2.35 -3,-2.55 3,-2.55 3,-2.35 ; -3,-2.35 -3,1.55 3,1.55 3,-2.35 ; -3,-2.35 3,-2.35
Mechanical 3:
  circle w0.1: c-2.348,-1.213 r0.215
  lines w0.1: -2.369,-2.35 ccw(c0,-1.55) 2.369,-2.35 ; -3,-2.35 3,-2.35 3,1.55 -3,1.55 -3,-2.35
3D body: height 1.65, standoff 0, extent -3,-2.55 3,-2.35
3D body: height 6.75, standoff 1.75, extent -2.487,-4.05 2.487,0.929
3D body: height 6.96, standoff 0, extent -3,-2.35 3,1.55
3D body: height 0, standoff -23.55, extent 2.19,-0.25 2.89,0.25
3D body: height 0, standoff -23.55, extent -0.35,-0.25 0.35,0.25
3D body: height 0, standoff -23.55, extent -2.89,-0.25 -2.19,0.25